# Altium footprint library TYCO THD.PcbLib: 146 footprints (part 1 of 11) (continued)
## TYCO_1-770182-0 [mm] "9 Circuits Vertiacal Mini-Universal MATE-N-LOK Connector" (continued)
  text "6" at -7.982,-0.505 h1.02
  text "4" at 7.318,-0.605 h1.02
  text "9" at -3.575,-8.032 h1.02
  text "8" at 0.565,-8.032 h1.02
  text "7" at 4.705,-8.032 h1.02
  text "3" at -3.715,7.355 h1.02
  text "1" at 4.64,7.555 h1.02
3D body "TYCO_1-770182-0.stp": height 14.25, standoff -4.32, extent -9.576,-7.747 9.576,8.281

## TYCO_1-770743-0 [mm] "10 Circuits Dual-Row Straight, Mini-Universal MATE-N-LOK Connector"
height 14.25
pads (11):
  round 2.1 hole 1.4: 1(8.28,2.07) 2(4.14,2.07) 3(0,2.07) 4(-4.14,2.07) 5(-8.28,2.07) 6(8.28,-2.07) 7(4.14,-2.07) 8(0,-2.07) 9(-4.14,-2.07) 10(-8.28,-2.07)
  round 0.5 hole 3.2 unplated mask+1.35: H1(12.751,2.07)
Top Overlay:
  lines w0.2: -11.151,-4.915 11.125,-4.915 11.125,0.993 ; -11.151,-3.34 -13.741,-3.34 -13.741,-0.8 -11.151,-0.8 ; -10.008,-4.915 -10.008,-5.677 -11.151,-5.677 -11.151,4.915 11.125,4.915 11.125,3.147 ; -7.01,-4.915 -7.01,-5.677 -5.867,-5.677 -5.867,-4.915 ; -2.87,-4.915 -2.87,-5.677 -1.727,-5.677 -1.727,-4.915 ; -1.511,4.915 -1.511,6.21 1.486,6.21 1.486,4.915 ; 1.27,-4.915 1.27,-5.677 2.413,-5.677 2.413,-4.915 ; 5.41,-4.915 5.41,-5.677 6.553,-5.677 6.553,-4.915 ; 9.55,-4.915 9.55,-5.677 10.693,-5.677 10.693,-4.915 ; 11.76,0.39 11.76,0.255 ccw(c12.522,2.07) 12.795,0.121 ; 11.76,3.75 11.76,3.885 cw(c12.522,2.07) 12.795,4.02 ; -10.058,-2.857 -10.058,-1.283 -9.068,-0.292 -6.502,-0.292 -6.502,-3.848 -9.068,-3.848 -10.058,-2.857 ; -10.058,1.283 -10.058,2.857 -9.068,3.848 -6.502,3.848 -6.502,0.292 -9.068,0.292 -10.058,1.283 ; -5.918,-3.848 -5.918,-0.292 -2.362,-0.292 -2.362,-3.848 -5.918,-3.848 ; -5.918,0.292 -2.362,0.292 -2.362,3.848 -5.918,3.848 -5.918,0.292 ; -1.778,-3.848 -1.778,-0.292 1.778,-0.292 1.778,-3.848 -1.778,-3.848 ; -1.778,0.292 -1.778,3.848 1.778,3.848 1.778,0.292 -1.778,0.292 ; 2.362,-2.857 2.362,-1.283 3.353,-0.292 5.918,-0.292 5.918,-3.848 3.353,-3.848 2.362,-2.857 ; 2.362,1.283 3.353,0.292 5.918,0.292 5.918,3.848 3.353,3.848 2.362,2.857 2.362,1.283 ; 6.502,-3.848 6.502,-0.292 10.058,-0.292 10.058,-3.848 6.502,-3.848 ; 6.502,0.292 10.058,0.292 10.058,3.848 6.502,3.848 6.502,0.292
  text "5" at -7.907,5.442 h1.02
  text "10" at -7.8,-6.9 h1.02
  text "6" at 8.8,-5.982 h1.02
  text "1" at 8.653,5.442 h1.02
Mechanical 8:
  lines w0.05: -8.78,-2.07 -8.28,-2.07 ; -8.78,2.07 -8.28,2.07 ; -8.28,-2.57 -8.28,-2.07 ; -8.28,-1.57 -8.28,-2.07 ; -8.28,1.57 -8.28,2.07 ; -8.28,2.57 -8.28,2.07 ; -7.78,-2.07 -8.28,-2.07 ; -7.78,2.07 -8.28,2.07 ; -4.64,-2.07 -4.14,-2.07 ; -4.64,2.07 -4.14,2.07 ; -4.14,-2.57 -4.14,-2.07 ; -4.14,-1.57 -4.14,-2.07 ; -4.14,1.57 -4.14,2.07 ; -4.14,2.57 -4.14,2.07 ; -3.64,-2.07 -4.14,-2.07 ; -3.64,2.07 -4.14,2.07 ; -0.5,-2.07 0,-2.07 ; -0.5,0 0,0 ; -0.5,2.07 0,2.07 ; 0,-2.57 0,-2.07 ; 0,-1.57 0,-2.07 ; 0,-0.5 0,0 ; 0,0.5 0,0 ; 0,1.57 0,2.07 ; 0,2.57 0,2.07 ; 0.5,-2.07 0,-2.07 ; 0.5,0 0,0 ; 0.5,2.07 0,2.07 ; 3.64,-2.07 4.14,-2.07 ; 3.64,2.07 4.14,2.07 ; 4.14,-2.57 4.14,-2.07 ; 4.14,-1.57 4.14,-2.07 ; 4.14,1.57 4.14,2.07 ; 4.14,2.57 4.14,2.07 ; 4.64,-2.07 4.14,-2.07 ; 4.64,2.07 4.14,2.07 ; 7.78,-2.07 8.28,-2.07 ; 7.78,2.07 8.28,2.07 ; 8.28,-2.57 8.28,-2.07 ; 8.28,-1.57 8.28,-2.07 ; 8.28,1.57 8.28,2.07 ; 8.28,2.57 8.28,2.07 ; 8.78,-2.07 8.28,-2.07 ; 8.78,2.07 8.28,2.07 ; 12.251,2.07 12.751,2.07 ; 12.751,1.57 12.751,2.07 ; 12.751,2.57 12.751,2.07 ; 13.251,2.07 12.751,2.07
Mechanical 14:
  circle w0.1: c8.28,-2.07 r0.5
  circle w0.1: c0,2.07 r0.5
  circle w0.1: c4.14,-2.07 r0.5
  circle w0.1: c0,-2.07 r0.5
  circle w0.1: c-4.14,2.07 r0.5
  circle w0.1: c-4.14,-2.07 r0.5
  circle w0.1: c-8.28,2.07 r0.5
  circle w0.1: c4.14,2.07 r0.5
  circle w0.1: c-8.28,-2.07 r0.5
  circle w0.1: c8.28,2.07 r0.5
  lines w0.1: -11.151,-4.915 11.125,-4.915 11.125,4.915 -11.151,4.915 -11.151,-5.677 -10.008,-5.677 -10.008,-4.915 ; -11.151,-3.34 -13.741,-3.34 -13.741,-0.8 -11.151,-0.8 ; -7.01,-4.915 -7.01,-5.677 -5.867,-5.677 -5.867,-4.915 ; -2.87,-4.915 -2.87,-5.677 -1.727,-5.677 -1.727,-4.915 ; -1.511,4.915 -1.511,6.21 1.486,6.21 1.486,4.915 ; 1.27,-4.915 1.27,-5.677 2.413,-5.677 2.413,-4.915 ; 5.41,-4.915 5.41,-5.677 6.553,-5.677 6.553,-4.915 ; 9.55,-4.915 9.55,-5.677 10.693,-5.677 10.693,-4.915 ; 11.125,1.308 11.76,1.308 11.76,0.255 ccw(c12.522,2.07) 13.691,0.486 13.691,3.654 ccw(c12.522,2.07) 11.76,3.885 11.76,2.832 11.125,2.832 ; 11.76,1.275 ccw(c12.751,2.07) 13.691,1.216 ; 11.76,2.865 cw(c12.751,2.07) 13.691,2.924 ; -10.058,-2.857 -10.058,-1.283 -9.068,-0.292 -6.502,-0.292 -6.502,-3.848 -9.068,-3.848 -10.058,-2.857 ; -10.058,1.283 -10.058,2.857 -9.068,3.848 -6.502,3.848 -6.502,0.292 -9.068,0.292 -10.058,1.283 ; -5.918,-3.848 -5.918,-0.292 -2.362,-0.292 -2.362,-3.848 -5.918,-3.848 ; -5.918,0.292 -2.362,0.292 -2.362,3.848 -5.918,3.848 -5.918,0.292 ; -1.778,-3.848 -1.778,-0.292 1.778,-0.292 1.778,-3.848 -1.778,-3.848 ; -1.778,0.292 -1.778,3.848 1.778,3.848 1.778,0.292 -1.778,0.292 ; 2.362,-2.857 2.362,-1.283 3.353,-0.292 5.918,-0.292 5.918,-3.848 3.353,-3.848 2.362,-2.857 ; 2.362,1.283 3.353,0.292 5.918,0.292 5.918,3.848 3.353,3.848 2.362,2.857 2.362,1.283 ; 6.502,-3.848 6.502,-0.292 10.058,-0.292 10.058,-3.848 6.502,-3.848 ; 6.502,0.292 10.058,0.292 10.058,3.848 6.502,3.848 6.502,0.292
  text "5" at -7.907,5.442 h1.02
  text "10" at -7.8,-6.9 h1.02
  text "6" at 8.8,-5.982 h1.02
  text "1" at 8.653,5.442 h1.02
3D body "TYCO_1-770743-0.stp": height 14.25, standoff -4.32, extent -13.741,-5.677 13.691,6.21

## TYCO_1-770966-0 [mm] "2 Circuits In-Line Right Angle, Mini-Universal MATE-N-LOK Connector"
height 7.77
pads (3):
  round 2.1 hole 1.4: 1(-2.07,0) 2(2.07,0)
  round 0.5 hole 3.9 unplated mask+1.7: H1(0,-7.34)
Top Overlay:
  lines w0.2: -4.94,-11.721 -6.236,-11.608 -6.236,-12.349 -4.94,-14.199 ; -3.607,-1.499 -3.607,0.508 -3.375,0.508 ; -2.565,-1.499 -2.565,-1.309 ; -1.575,-1.499 -1.575,-1.309 ; -1.511,-14.199 -1.511,-11.608 1.486,-11.608 1.486,-14.199 ; -1.511,-12.349 1.486,-12.349 ; -0.766,0.508 -0.533,0.508 -0.533,-1.499 ; 0.533,-1.499 0.533,0.508 0.766,0.508 ; 1.575,-1.499 1.575,-1.309 ; 2.565,-1.499 2.565,-1.309 ; 3.375,0.508 3.607,0.508 3.607,-1.499 ; -4.94,-14.199 -4.94,-1.499 4.915,-1.499 4.915,-14.199 -4.94,-14.199
  text "2" at 4.1,-0.9 h1
  text "1" at -4.6,-0.9 h1
Mechanical 8:
  lines w0.05: -2.57,0 -2.07,0 ; -2.07,-0.5 -2.07,0 ; -2.07,0.5 -2.07,0 ; -1.57,0 -2.07,0 ; -0.5,-7.34 0,-7.34 ; -0.5,0 0,0 ; 0,-7.84 0,-7.34 ; 0,-6.84 0,-7.34 ; 0,-0.5 0,0 ; 0,0.5 0,0 ; 0.5,-7.34 0,-7.34 ; 0.5,0 0,0 ; 1.57,0 2.07,0 ; 2.07,-0.5 2.07,0 ; 2.07,0.5 2.07,0 ; 2.57,0 2.07,0
Mechanical 14:
  lines w0.1: -4.94,-11.721 -6.236,-11.608 -6.236,-12.349 -4.94,-14.199 ; -3.607,-1.499 -3.607,0.508 -2.565,0.508 -2.565,-1.499 ; -2.565,0.071 cw(c-2.07,0) -1.575,0.071 ; -1.575,-1.499 -1.575,0.508 -0.533,0.508 -0.533,-1.499 ; -1.511,-14.199 -1.511,-11.608 1.486,-11.608 1.486,-14.199 ; -1.511,-12.349 1.486,-12.349 ; 0.533,-1.499 0.533,0.508 1.575,0.508 1.575,-1.499 ; 1.575,0.071 cw(c2.07,0) 2.565,0.071 ; 2.565,-1.499 2.565,0.508 3.607,0.508 3.607,-1.499 ; -4.94,-14.199 -4.94,-1.499 4.915,-1.499 4.915,-14.199 -4.94,-14.199
  text "2" at 4.1,-0.9 h1
  text "1" at -4.6,-0.9 h1
3D body "TYCO_1-770966-0.stp": height 7.77, standoff -5.23, extent -6.236,-14.198 4.915,0.508

## TYCO_1-770968-0 [mm] "4 Circuits Dual-Row Right Angle - Mini-Universal MATE-N-LOK Connector"
height 11.86
pads (5):
  round 2 hole 1.3: 1(2.07,2.07) 2(-2.07,2.07) 3(2.07,-2.07) 4(-2.07,-2.07)
  round 0.5 hole 3.9 unplated mask+1.7: H1(0,-9.41)
Top Overlay:
  lines w0.2: -4.94,-3.569 4.915,-3.569 ; -3.331,2.553 -3.95,2.553 ccw(c-3.95,1.562) -4.94,1.562 -4.94,-16.269 4.915,-16.269 4.915,1.562 ccw(c3.924,1.562) 3.924,2.553 3.331,2.553 ; -2.565,-3.569 -2.565,-3.326 ; -2.566,-0.814 -2.566,0.814 ; -1.575,-3.569 -1.575,-3.326 ; -1.575,-0.814 -1.575,0.814 ; -1.511,-16.269 -1.511,-13.678 1.486,-13.678 1.486,-16.269 ; -1.511,-14.419 1.486,-14.419 ; -0.809,2.553 0.809,2.553 ; 1.575,-3.569 1.575,-3.326 ; 1.574,-0.814 1.574,0.814 ; 2.565,-3.569 2.565,-3.326 ; 2.565,-0.814 2.565,0.814
  text "1" at 3,3 h1.02
  text "2" at -3.9,3 h1.02
  text "4" at -4.4,-3.2 h1.02
  text "3" at 3.6,-3.218 h1.02
Mechanical 8:
  lines w0.05: -2.57,-2.07 -2.07,-2.07 ; -2.57,2.07 -2.07,2.07 ; -2.07,-2.57 -2.07,-2.07 ; -2.07,-1.57 -2.07,-2.07 ; -2.07,1.57 -2.07,2.07 ; -2.07,2.57 -2.07,2.07 ; -1.57,-2.07 -2.07,-2.07 ; -1.57,2.07 -2.07,2.07 ; -0.5,-9.41 0,-9.41 ; -0.5,0 0,0 ; 0,-9.91 0,-9.41 ; 0,-8.91 0,-9.41 ; 0,-0.5 0,0 ; 0,0.5 0,0 ; 0.5,-9.41 0,-9.41 ; 0.5,0 0,0 ; 1.57,-2.07 2.07,-2.07 ; 1.57,2.07 2.07,2.07 ; 2.07,-2.57 2.07,-2.07 ; 2.07,-1.57 2.07,-2.07 ; 2.07,1.57 2.07,2.07 ; 2.07,2.57 2.07,2.07 ; 2.57,-2.07 2.07,-2.07 ; 2.57,2.07 2.07,2.07
Mechanical 14:
  lines w0.1: -4.94,-3.569 4.915,-3.569 ; -2.566,-3.569 -2.566,2.553 -3.95,2.553 ccw(c-3.95,1.562) -4.94,1.562 -4.94,-16.269 4.915,-16.269 4.915,1.562 ccw(c3.924,1.562) 3.924,2.553 2.565,2.553 2.565,-3.569 ; -1.575,-3.569 -1.575,2.553 1.575,2.553 1.575,-3.569 ; -1.511,-16.269 -1.511,-13.678 1.486,-13.678 1.486,-16.269 ; -1.511,-14.419 1.486,-14.419
  text "1" at 3,3 h1.02
  text "2" at -3.9,3 h1.02
  text "4" at -4.4,-3.2 h1.02
  text "3" at 3.6,-3.218 h1.02
3D body "TYCO_1-770968-0.stp": height 11.86, standoff -5.23, extent -4.941,-16.269 4.915,2.57

## TYCO_1-770970-0 [mm] "8 Circuits Dual-Row Right Angle, Mini-Universal MATE-N-LOK Connector"
height 11.86
pads (9):
  round 2.1 hole 1.4: 1(6.21,2.07) 2(2.07,2.07) 3(-2.07,2.07) 4(-6.21,2.07) 5(6.21,-2.07) 6(2.07,-2.07) 7(-2.07,-2.07) 8(-6.21,-2.07)
  round 0.5 hole 3.9 unplated mask+1.7: H1(0,-9.41)
Top Overlay:
  lines w0.2: -9.081,-3.569 9.055,-3.569 ; -7.524,2.553 -9.081,2.553 -9.081,-16.269 9.055,-16.269 9.055,2.553 7.524,2.553 ; -6.711,-3.569 -6.711,-3.377 ; -6.711,-0.763 -6.711,0.763 ; -5.71,-3.569 -5.71,-3.377 ; -5.71,-0.763 -5.71,0.763 ; -4.896,2.553 -3.384,2.553 ; -2.571,-3.569 -2.571,-3.377 ; -2.571,-0.763 -2.571,0.763 ; -1.57,-3.569 -1.57,-3.377 ; -1.57,-0.763 -1.57,0.763 ; -1.512,-16.269 -1.512,-13.678 1.486,-13.678 1.486,-16.269 ; -1.512,-14.419 1.486,-14.419 ; -0.756,2.553 0.756,2.553 ; 1.569,-3.569 1.569,-3.377 ; 1.569,-0.763 1.569,0.763 ; 2.57,-3.569 2.57,-3.377 ; 2.57,-0.762 2.57,0.763 ; 3.384,2.553 4.896,2.553 ; 5.71,-3.569 5.71,-3.377 ; 5.71,-0.763 5.71,0.763 ; 6.71,-3.569 6.71,-3.377 ; 6.71,-0.763 6.71,0.763
  text "1" at 8,1 h1
  text "4" at -8.5,1.1 h1
  text "8" at -8.4,-2.5 h1
  text "5" at 7.8,-2.6 h1
Mechanical 8:
  lines w0.05: -6.71,-2.07 -6.21,-2.07 ; -6.71,2.07 -6.21,2.07 ; -6.21,-2.57 -6.21,-2.07 ; -6.21,-1.57 -6.21,-2.07 ; -6.21,1.57 -6.21,2.07 ; -6.21,2.57 -6.21,2.07 ; -5.71,-2.07 -6.21,-2.07 ; -5.71,2.07 -6.21,2.07 ; -2.57,-2.07 -2.07,-2.07 ; -2.57,2.07 -2.07,2.07 ; -2.07,-2.57 -2.07,-2.07 ; -2.07,-1.57 -2.07,-2.07 ; -2.07,1.57 -2.07,2.07 ; -2.07,2.57 -2.07,2.07 ; -1.57,-2.07 -2.07,-2.07 ; -1.57,2.07 -2.07,2.07 ; -0.5,-9.41 0,-9.41 ; -0.5,0 0,0 ; 0,-9.91 0,-9.41 ; 0,-8.91 0,-9.41 ; 0,-0.5 0,0 ; 0,0.5 0,0 ; 0.5,-9.41 0,-9.41 ; 0.5,0 0,0 ; 1.57,-2.07 2.07,-2.07 ; 1.57,2.07 2.07,2.07 ; 2.07,-2.57 2.07,-2.07 ; 2.07,-1.57 2.07,-2.07 ; 2.07,1.57 2.07,2.07 ; 2.07,2.57 2.07,2.07 ; 2.57,-2.07 2.07,-2.07 ; 2.57,2.07 2.07,2.07 ; 5.71,-2.07 6.21,-2.07 ; 5.71,2.07 6.21,2.07 ; 6.21,-2.57 6.21,-2.07 ; 6.21,-1.57 6.21,-2.07 ; 6.21,1.57 6.21,2.07 ; 6.21,2.57 6.21,2.07 ; 6.71,-2.07 6.21,-2.07 ; 6.71,2.07 6.21,2.07
Mechanical 14:
  lines w0.1: -9.081,-3.569 9.055,-3.569 ; -6.711,-3.569 -6.711,1.794 cw(c-6.211,1.794) -5.71,1.794 -5.71,-3.569 ; -2.571,-3.569 -2.571,1.794 cw(c-2.07,1.794) -1.57,1.794 -1.57,-3.569 ; -1.512,-16.269 -1.512,-13.678 1.486,-13.678 1.486,-16.269 ; -1.512,-14.419 1.486,-14.419 ; 1.569,-3.569 1.569,1.794 cw(c2.07,1.794) 2.57,1.794 2.57,-3.569 ; 5.71,-3.569 5.71,1.794 cw(c6.21,1.794) 6.71,1.794 6.71,-3.569 ; -9.081,-16.269 -9.081,2.553 9.055,2.553 9.055,-16.269 -9.081,-16.269
  text "1" at 8,1 h1
  text "4" at -8.5,1.1 h1
  text "8" at -8.4,-2.5 h1
  text "5" at 7.8,-2.6 h1
3D body "TYCO_1-770971-0.stp": height 11.86, standoff -5.23, extent -9.081,-16.269 9.055,2.571

## TYCO_1-770971-0 [mm] "10 Circuits Dual-Row Right Angle - Mini-Universal MATE-N-LOK Connector"
height 11.86
pads (11):
  round 2 hole 1.3: 1(8.28,2.07) 2(4.14,2.07) 3(0,2.07) 4(-4.14,2.07) 5(-8.28,2.07) 6(8.28,-2.07) 7(4.14,-2.07) 8(0,-2.07) 9(-4.14,-2.07) 10(-8.28,-2.07)
  round 0.5 hole 3.9 unplated mask+1.7: H1(0,-9.41)
Top Overlay:
  lines w0.2: -11.151,-3.569 11.125,-3.569 ; -9.541,2.553 -10.135,2.553 ccw(c-10.135,1.537) -11.151,1.537 -11.151,-16.269 11.125,-16.269 11.125,1.537 ccw(c10.109,1.537) 10.109,2.553 9.54,2.553 ; -8.775,-3.569 -8.775,-3.326 ; -8.775,-0.814 -8.775,0.814 ; -7.785,-3.569 -7.785,-3.326 ; -7.785,-0.814 -7.785,0.814 ; -7.02,2.553 -5.401,2.553 ; -4.635,-3.569 -4.635,-3.326 ; -4.635,-0.814 -4.635,0.814 ; -3.645,-3.569 -3.645,-3.326 ; -3.645,-0.814 -3.645,0.814 ; -2.88,2.553 -1.261,2.553 ; -1.512,-16.269 -1.512,-13.678 1.486,-13.678 1.486,-16.269 ; -1.512,-14.419 1.486,-14.419 ; -0.495,-3.569 -0.495,-3.326 ; -0.495,-0.814 -0.495,0.814 ; 0.495,-3.569 0.495,-3.326 ; 0.495,-0.814 0.495,0.814 ; 1.26,2.553 2.879,2.553 ; 3.645,-3.569 3.645,-3.326 ; 3.645,-0.814 3.645,0.814 ; 4.635,-3.569 4.635,-3.326 ; 4.635,-0.814 4.635,0.814 ; 5.4,2.553 7.019,2.553 ; 7.785,-3.569 7.785,-3.326 ; 7.785,-0.814 7.785,0.814 ; 8.775,-3.569 8.775,-3.326 ; 8.775,-0.814 8.775,0.814
  text "6" at 9.8,-3.2 h1.02
  text "10" at -10.9,-3.3 h1.02
  text "5" at -10.035,2.953 h1.02
  text "1" at 9.3,2.9 h1.02
Mechanical 8:
  lines w0.05: -8.78,-2.07 -8.28,-2.07 ; -8.78,2.07 -8.28,2.07 ; -8.28,-2.57 -8.28,-2.07 ; -8.28,-1.57 -8.28,-2.07 ; -8.28,1.57 -8.28,2.07 ; -8.28,2.57 -8.28,2.07 ; -7.78,-2.07 -8.28,-2.07 ; -7.78,2.07 -8.28,2.07 ; -4.64,-2.07 -4.14,-2.07 ; -4.64,2.07 -4.14,2.07 ; -4.14,-2.57 -4.14,-2.07 ; -4.14,-1.57 -4.14,-2.07 ; -4.14,1.57 -4.14,2.07 ; -4.14,2.57 -4.14,2.07 ; -3.64,-2.07 -4.14,-2.07 ; -3.64,2.07 -4.14,2.07 ; -0.5,-9.41 0,-9.41 ; -0.5,-2.07 0,-2.07 ; -0.5,0 0,0 ; -0.5,2.07 0,2.07 ; 0,-9.91 0,-9.41 ; 0,-8.91 0,-9.41 ; 0,-2.57 0,-2.07 ; 0,-1.57 0,-2.07 ; 0,-0.5 0,0 ; 0,0.5 0,0 ; 0,1.57 0,2.07 ; 0,2.57 0,2.07 ; 0.5,-9.41 0,-9.41 ; 0.5,-2.07 0,-2.07 ; 0.5,0 0,0 ; 0.5,2.07 0,2.07 ; 3.64,-2.07 4.14,-2.07 ; 3.64,2.07 4.14,2.07 ; 4.14,-2.57 4.14,-2.07 ; 4.14,-1.57 4.14,-2.07 ; 4.14,1.57 4.14,2.07 ; 4.14,2.57 4.14,2.07 ; 4.64,-2.07 4.14,-2.07 ; 4.64,2.07 4.14,2.07 ; 7.78,-2.07 8.28,-2.07 ; 7.78,2.07 8.28,2.07 ; 8.28,-2.57 8.28,-2.07 ; 8.28,-1.57 8.28,-2.07 ; 8.28,1.57 8.28,2.07 ; 8.28,2.57 8.28,2.07 ; 8.78,-2.07 8.28,-2.07 ; 8.78,2.07 8.28,2.07
Mechanical 14:
  lines w0.1: -11.151,-3.569 11.125,-3.569 ; -8.776,-3.569 -8.776,2.553 -10.135,2.553 ccw(c-10.135,1.537) -11.151,1.537 -11.151,-16.269 11.125,-16.269 11.125,1.537 ccw(c10.109,1.537) 10.109,2.553 8.775,2.553 8.775,-3.569 ; -7.785,-3.569 -7.785,2.553 -4.636,2.553 -4.636,-3.569 ; -3.645,-3.569 -3.645,2.553 -0.496,2.553 -0.496,-3.569 ; -1.512,-16.269 -1.512,-13.678 1.486,-13.678 1.486,-16.269 ; -1.512,-14.419 1.486,-14.419 ; 0.495,-3.569 0.495,2.553 3.645,2.553 3.645,-3.569 ; 4.635,-3.569 4.635,2.553 7.785,2.553 7.785,-3.569
  text "6" at 9.8,-3.2 h1.02
  text "10" at -10.9,-3.3 h1.02
  text "5" at -10.035,2.953 h1.02
  text "1" at 9.3,2.9 h1.02
3D body "TYCO_1-770971-0.stp": height 11.86, standoff -5.23, extent -11.151,-16.269 11.125,2.57

## TYCO_1-794065-0 [mm] "8 Circuits Double Row Vertiacal Mini-Universal MATE-N-LOK Connector"
height 14.25
pads (9):
  round 2.1 hole 1.4: 1(6.21,2.07) 2(2.07,2.07) 3(-2.07,2.07) 4(-6.21,2.07) 5(6.21,-2.07) 6(2.07,-2.07) 7(-2.07,-2.07) 8(-6.21,-2.07)
  round 0.5 hole 3.2 unplated mask+1.35: 9(10.655,2.07)
Top Overlay:
  lines w0.2: -9.055,-4.915 9.055,-4.915 9.055,0.975 ; -9.055,-3.34 -11.645,-3.34 -11.645,-0.8 -9.055,-0.8 ; -7.912,-4.915 -7.912,-5.677 -9.055,-5.677 -9.055,4.915 9.055,4.915 9.055,3.15 ; -4.915,-4.915 -4.915,-5.677 -3.772,-5.677 -3.772,-4.915 ; -1.499,4.915 -1.499,6.21 1.499,6.21 1.499,4.915 ; -0.775,-4.915 -0.775,-5.677 0.368,-5.677 0.368,-4.915 ; 3.365,-4.915 3.365,-5.677 4.508,-5.677 4.508,-4.915 ; 7.505,-4.915 7.505,-5.677 8.648,-5.677 8.648,-4.915 ; 9.69,0.451 9.69,0.255 ccw(c10.426,2.081) 10.867,0.162 ; 9.69,3.689 9.69,3.885 cw(c10.426,2.059) 10.867,3.978 ; -7.988,-3.848 -4.432,-3.848 -4.432,-0.292 -7.988,-0.292 -7.988,-3.848 ; -7.988,1.384 -6.896,0.292 -4.432,0.292 -4.432,3.848 -6.896,3.848 -7.988,2.756 -7.988,1.384 ; -3.848,-3.848 -0.292,-3.848 -0.292,-0.292 -3.848,-0.292 -3.848,-3.848 ; -3.848,0.292 -3.848,3.848 -0.292,3.848 -0.292,0.292 -3.848,0.292 ; 0.292,-3.848 0.292,-0.292 3.848,-0.292 3.848,-3.848 0.292,-3.848 ; 0.292,0.292 0.292,3.848 3.848,3.848 3.848,0.292 0.292,0.292 ; 4.432,-3.848 7.988,-3.848 7.988,-0.292 4.432,-0.292 4.432,-3.848 ; 4.432,0.292 6.896,0.292 7.988,1.384 7.988,2.756 6.896,3.848 4.432,3.848 4.432,0.292
  text "8" at -5.69,-5.982 h1.02
  text "7" at -1.55,-5.982 h1.02
  text "6" at 2.59,-5.982 h1.02
  text "5" at 6.805,-5.982 h1.02
  text "4" at -5.705,5.305 h1.02
  text "3" at -2.04,5.305 h1.02
  text "2" at 3.125,5.28 h1.02
  text "1" at 6.765,5.43 h1.02
Mechanical 8:
  lines w0.1: -7.21,-2.07 -6.21,-2.07 ; -7.21,2.07 -6.21,2.07 ; -6.21,-3.07 -6.21,-2.07 ; -6.21,-1.07 -6.21,-2.07 ; -6.21,1.07 -6.21,2.07 ; -6.21,3.07 -6.21,2.07 ; -5.21,-2.07 -6.21,-2.07 ; -5.21,2.07 -6.21,2.07 ; -3.07,-2.07 -2.07,-2.07 ; -3.07,2.07 -2.07,2.07 ; -2.07,-3.07 -2.07,-2.07 ; -2.07,-1.07 -2.07,-2.07 ; -2.07,1.07 -2.07,2.07 ; -2.07,3.07 -2.07,2.07 ; -1.07,-2.07 -2.07,-2.07 ; -1.07,2.07 -2.07,2.07 ; -1,0 0,0 ; 0,-1 0,0 ; 0,1 0,0 ; 1,0 0,0 ; 1.07,-2.07 2.07,-2.07 ; 1.07,2.07 2.07,2.07 ; 2.07,-3.07 2.07,-2.07 ; 2.07,-1.07 2.07,-2.07 ; 2.07,1.07 2.07,2.07 ; 2.07,3.07 2.07,2.07 ; 3.07,-2.07 2.07,-2.07 ; 3.07,2.07 2.07,2.07 ; 5.21,-2.07 6.21,-2.07 ; 5.21,2.07 6.21,2.07 ; 6.21,-3.07 6.21,-2.07 ; 6.21,-1.07 6.21,-2.07 ; 6.21,1.07 6.21,2.07 ; 6.21,3.07 6.21,2.07 ; 7.21,-2.07 6.21,-2.07 ; 7.21,2.07 6.21,2.07 ; 9.655,2.07 10.655,2.07 ; 10.655,1.07 10.655,2.07 ; 10.655,3.07 10.655,2.07 ; 11.655,2.07 10.655,2.07
Mechanical 14:
  drawing of 172 lines, arcs and shapes, not listed
  text "8" at -5.69,-5.982 h1.02
  text "7" at -1.55,-5.982 h1.02
  text "6" at 2.59,-5.982 h1.02
  text "5" at 6.805,-5.982 h1.02
  text "4" at -5.705,5.305 h1.02
  text "3" at -2.04,5.305 h1.02
  text "2" at 3.125,5.28 h1.02
  text "1" at 6.765,5.43 h1.02
3D body "TYCO_1-794065-0.stp": height 14.25, standoff -4.06, extent -11.645,-5.677 11.62,6.21

## TYCO_1-794067-0 [mm] "14 Circuits Double Row Vertiacal Mini-Universal MATE-N-LOK Connector"
height 14.25
pads (16):
  round 2.1 hole 1.4: 1(12.42,2.07) 2(8.28,2.07) 3(4.14,2.07) 4(0,2.07) 5(-4.14,2.07) 6(-8.28,2.07) 7(-12.42,2.07) 8(12.42,-2.07) 9(8.28,-2.07) 10(4.14,-2.07) 11(-0.001,-2.07) 12(-4.141,-2.07) 13(-8.281,-2.07) 14(-12.421,-2.07)
  round 0.5 hole 3.2 unplated mask+1.35: 15(16.87,2.07) 16(-16.87,2.07)
Top Overlay:
  lines w0.2: -15.265,-4.915 -13.1,-4.915 ; -15.265,0.963 -15.265,-5.677 -14.122,-5.677 -14.122,-4.915 ; -15.265,3.177 -15.265,4.915 15.265,4.915 15.265,3.178 ; -11.6,-4.915 15.265,-4.915 15.265,0.962 ; -11.124,-4.915 -11.124,-5.677 -9.981,-5.677 -9.981,-4.915 ; -6.984,-4.915 -6.984,-5.677 -5.841,-5.677 -5.841,-4.915 ; -2.844,-4.915 -2.844,-5.677 -1.701,-5.677 -1.701,-4.915 ; -1.498,4.915 -1.498,6.21 1.499,6.21 1.499,4.915 ; 1.295,-4.915 1.295,-5.677 2.438,-5.677 2.438,-4.915 ; 5.436,-4.915 5.436,-5.677 6.579,-5.677 6.579,-4.915 ; 9.576,-4.915 9.576,-5.677 10.719,-5.677 10.719,-4.915 ; 13.716,-4.915 13.716,-5.677 14.859,-5.677 14.859,-4.915 ; -14.198,-3.848 -10.642,-3.848 -10.642,-0.292 -14.198,-0.292 -14.198,-3.848 ; -14.198,0.292 -11.734,0.292 -10.642,1.384 -10.642,2.756 -11.734,3.848 -14.198,3.848 -14.198,0.292 ; -10.058,-3.848 -6.502,-3.848 -6.502,-0.292 -10.058,-0.292 -10.058,-3.848 ; -10.058,0.292 -10.058,3.848 -6.502,3.848 -6.502,0.292 -10.058,0.292 ; -5.917,-3.848 -2.361,-3.848 -2.361,-0.292 -5.917,-0.292 -5.917,-3.848 ; -5.917,0.292 -5.917,3.848 -2.361,3.848 -2.361,0.292 -5.917,0.292 ; -1.778,-3.848 -1.778,-1.385 -0.685,-0.292 0.686,-0.292 1.778,-1.385 1.778,-3.848 -1.778,-3.848 ; -1.778,0.292 -1.778,2.756 -0.685,3.848 0.686,3.848 1.778,2.756 1.778,0.292 -1.778,0.292 ; 2.362,-3.848 5.918,-3.848 5.918,-0.292 2.362,-0.292 2.362,-3.848 ; 2.362,0.292 5.918,0.292 5.918,3.848 2.362,3.848 2.362,0.292 ; 6.502,-3.848 6.502,-0.292 10.058,-0.292 10.058,-3.848 6.502,-3.848 ; 6.502,0.292 10.058,0.292 10.058,3.848 6.502,3.848 6.502,0.292 ; 10.643,-3.848 10.643,-0.292 14.199,-0.292 14.199,-3.848 10.643,-3.848 ; 10.643,0.292 14.199,0.292 14.199,2.756 13.106,3.848 11.735,3.848 10.643,2.756 10.643,0.292
  text "1" at 12.872,5.485 h1
  text "14" at -11.85,-5.653 h1
  text "8" at 12.889,-5.962 h1
  text "7" at -11.952,5.324 h1
Mechanical 8:
  lines w0.05: -17.37,2.07 -16.87,2.07 ; -16.87,1.57 -16.87,2.07 ; -16.87,2.57 -16.87,2.07 ; -16.37,2.07 -16.87,2.07 ; -12.92,-2.07 -12.42,-2.07 ; -12.92,2.07 -12.42,2.07 ; -12.42,-2.57 -12.42,-2.07 ; -12.42,-1.57 -12.42,-2.07 ; -12.42,1.57 -12.42,2.07 ; -12.42,2.57 -12.42,2.07 ; -11.92,-2.07 -12.42,-2.07 ; -11.92,2.07 -12.42,2.07 ; -8.78,-2.07 -8.28,-2.07 ; -8.78,2.07 -8.28,2.07 ; -8.28,-2.57 -8.28,-2.07 ; -8.28,-1.57 -8.28,-2.07 ; -8.28,1.57 -8.28,2.07 ; -8.28,2.57 -8.28,2.07 ; -7.78,-2.07 -8.28,-2.07 ; -7.78,2.07 -8.28,2.07 ; -4.64,-2.07 -4.14,-2.07 ; -4.64,2.07 -4.14,2.07 ; -4.14,-2.57 -4.14,-2.07 ; -4.14,-1.57 -4.14,-2.07 ; -4.14,1.57 -4.14,2.07 ; -4.14,2.57 -4.14,2.07 ; -3.64,-2.07 -4.14,-2.07 ; -3.64,2.07 -4.14,2.07 ; -0.5,-2.07 0,-2.07 ; -0.5,0 0,0 ; -0.5,2.07 0,2.07 ; 0,-2.57 0,-2.07 ; 0,-1.57 0,-2.07 ; 0,-0.5 0,0 ; 0,0.5 0,0 ; 0,1.57 0,2.07 ; 0,2.57 0,2.07 ; 0.5,-2.07 0,-2.07 ; 0.5,0 0,0 ; 0.5,2.07 0,2.07 ; 3.64,-2.07 4.14,-2.07 ; 3.64,2.07 4.14,2.07 ; 4.14,-2.57 4.14,-2.07 ; 4.14,-1.57 4.14,-2.07 ; 4.14,1.57 4.14,2.07 ; 4.14,2.57 4.14,2.07 ; 4.64,-2.07 4.14,-2.07 ; 4.64,2.07 4.14,2.07 ; 7.78,-2.07 8.28,-2.07 ; 7.78,2.07 8.28,2.07 ; 8.28,-2.57 8.28,-2.07 ; 8.28,-1.57 8.28,-2.07 ; 8.28,1.57 8.28,2.07 ; 8.28,2.57 8.28,2.07 ; 8.78,-2.07 8.28,-2.07 ; 8.78,2.07 8.28,2.07 ; 11.92,-2.07 12.42,-2.07 ; 11.92,2.07 12.42,2.07 ; 12.42,-2.57 12.42,-2.07 ; 12.42,-1.57 12.42,-2.07 ; 12.42,1.57 12.42,2.07 ; 12.42,2.57 12.42,2.07 ; 12.92,-2.07 12.42,-2.07 ; 12.92,2.07 12.42,2.07 ; 16.37,2.07 16.87,2.07 ; 16.87,1.57 16.87,2.07 ; 16.87,2.57 16.87,2.07 ; 17.37,2.07 16.87,2.07
Mechanical 14:
  circle w0.1: c4.14,2.07 r0.5
  circle w0.1: c4.14,-2.07 r0.5
  circle w0.1: c8.28,2.07 r0.5
  circle w0.1: c8.28,-2.07 r0.5
  circle w0.1: c12.421,2.07 r0.5
  circle w0.1: c12.421,-2.07 r0.5
  circle w0.1: c-12.421,2.07 r0.5
  circle w0.1: c-12.421,-2.07 r0.5
  circle w0.1: c-8.28,2.07 r0.5
  circle w0.1: c-8.28,-2.07 r0.5
  circle w0.1: c-4.14,2.07 r0.5
  circle w0.1: c-4.14,-2.07 r0.5
  circle w0.1: c0,2.07 r0.5
  circle w0.1: c0,-2.07 r0.5
  lines w0.1: -17.856,1.246 ccw(c-16.89,2.07) -15.9,1.275 ; -17.856,2.895 cw(c-16.89,2.07) -15.9,2.865 ; -15.265,-4.915 -13.1,-4.915 ; -15.265,1.308 -15.874,1.308 -15.874,0.266 cw(c-16.662,2.07) -17.856,0.506 -17.856,3.635 cw(c-16.662,2.07) -15.874,3.874 -15.874,2.832 -15.265,2.832 ; -14.122,-4.915 -14.122,-5.677 -15.265,-5.677 -15.265,4.915 15.265,4.915 15.265,-4.915 -11.6,-4.915 ; -11.124,-4.915 -11.124,-5.677 -9.981,-5.677 -9.981,-4.915 ; -6.984,-4.915 -6.984,-5.677 -5.841,-5.677 -5.841,-4.915 ; -2.844,-4.915 -2.844,-5.677 -1.701,-5.677 -1.701,-4.915 ; -1.498,4.915 -1.498,6.21 1.499,6.21 1.499,4.915 ; 1.295,-4.915 1.295,-5.677 2.438,-5.677 2.438,-4.915 ; 5.436,-4.915 5.436,-5.677 6.579,-5.677 6.579,-4.915 ; 9.576,-4.915 9.576,-5.677 10.719,-5.677 10.719,-4.915 ; 13.716,-4.915 13.716,-5.677 14.859,-5.677 14.859,-4.915 ; 15.265,1.308 15.875,1.308 15.875,0.266 ccw(c16.662,2.07) 17.857,0.506 17.857,3.635 ccw(c16.662,2.07) 15.875,3.874 15.875,2.832 15.265,2.832 ; 15.9,1.275 ccw(c16.891,2.07) 17.857,1.246 ; 15.9,2.865 cw(c16.891,2.07) 17.857,2.895 ; -14.198,-3.848 -10.642,-3.848 -10.642,-0.292 -14.198,-0.292 -14.198,-3.848 ; -14.198,0.292 -11.734,0.292 -10.642,1.384 -10.642,2.756 -11.734,3.848 -14.198,3.848 -14.198,0.292 ; -10.058,-3.848 -6.502,-3.848 -6.502,-0.292 -10.058,-0.292 -10.058,-3.848 ; -10.058,0.292 -10.058,3.848 -6.502,3.848 -6.502,0.292 -10.058,0.292 ; -5.917,-3.848 -2.361,-3.848 -2.361,-0.292 -5.917,-0.292 -5.917,-3.848 ; -5.917,0.292 -5.917,3.848 -2.361,3.848 -2.361,0.292 -5.917,0.292 ; -1.778,-3.848 -1.778,-1.385 -0.685,-0.292 0.686,-0.292 1.778,-1.385 1.778,-3.848 -1.778,-3.848 ; -1.778,0.292 -1.778,2.756 -0.685,3.848 0.686,3.848 1.778,2.756 1.778,0.292 -1.778,0.292 ; 2.362,-3.848 5.918,-3.848 5.918,-0.292 2.362,-0.292 2.362,-3.848 ; 2.362,0.292 5.918,0.292 5.918,3.848 2.362,3.848 2.362,0.292 ; 6.502,-3.848 6.502,-0.292 10.058,-0.292 10.058,-3.848 6.502,-3.848 ; 6.502,0.292 10.058,0.292 10.058,3.848 6.502,3.848 6.502,0.292 ; 10.643,-3.848 10.643,-0.292 14.199,-0.292 14.199,-3.848 10.643,-3.848 ; 10.643,0.292 14.199,0.292 14.199,2.756 13.106,3.848 11.735,3.848 10.643,2.756 10.643,0.292
  text "1" at 12.872,5.485 h1
  text "14" at -11.85,-5.653 h1
  text "8" at 12.889,-5.962 h1
  text "7" at -11.952,5.324 h1
3D body "TYCO_1-794067-0.stp": height 14.25, standoff -4.06, extent -17.856,-5.677 17.857,6.21